# Altium footprint library CONN_HDR.PcbLib: 157 footprints (part 12 of 12)
Each footprint in its own frame and in the unit in brackets; x right, y up, seen from the top. Pads: shape width x height; smd on the part's side, far side on the other; paste and mask are expansions set on the pad; w line width, h text height; cw(c..) or ccw(c..) is an arc to the next point about the centre after c.
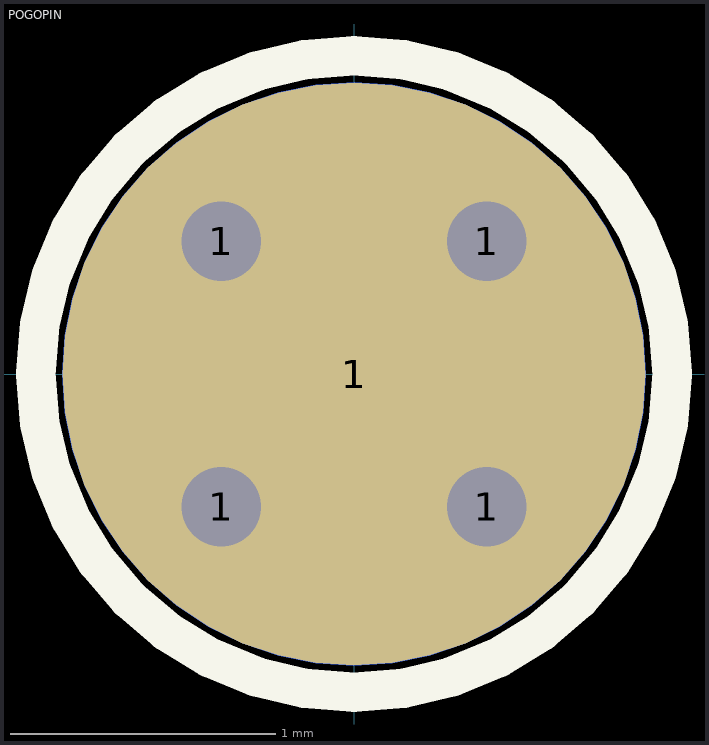
[diagram p11: the footprint, top view; thin cyan lines are the x and y axes]

## POGOPIN [mm]
pads (6):
  round 0.6 hole 0.3: 1(-0.5,-0.5) 1(-0.5,0.5) 1(0.5,-0.5) 1(0.5,0.5)
  round 2.2 smd mask+0.075: 1(0,0)
  round 2.2 smd far side mask+0.075: 1(0,0)
TopOverlay:
  circle w0.15: c0,0 r1.2